# Altium footprint library 3.22-杂项.PcbLib: 985 footprints (part 58 of 64)
Each footprint in its own frame and in the unit in brackets; x right, y up, seen from the top. Pads: shape width x height; smd on the part's side, far side on the other; paste and mask are expansions set on the pad; w line width, h text height; cw(c..) or ccw(c..) is an arc to the next point about the centre after c.
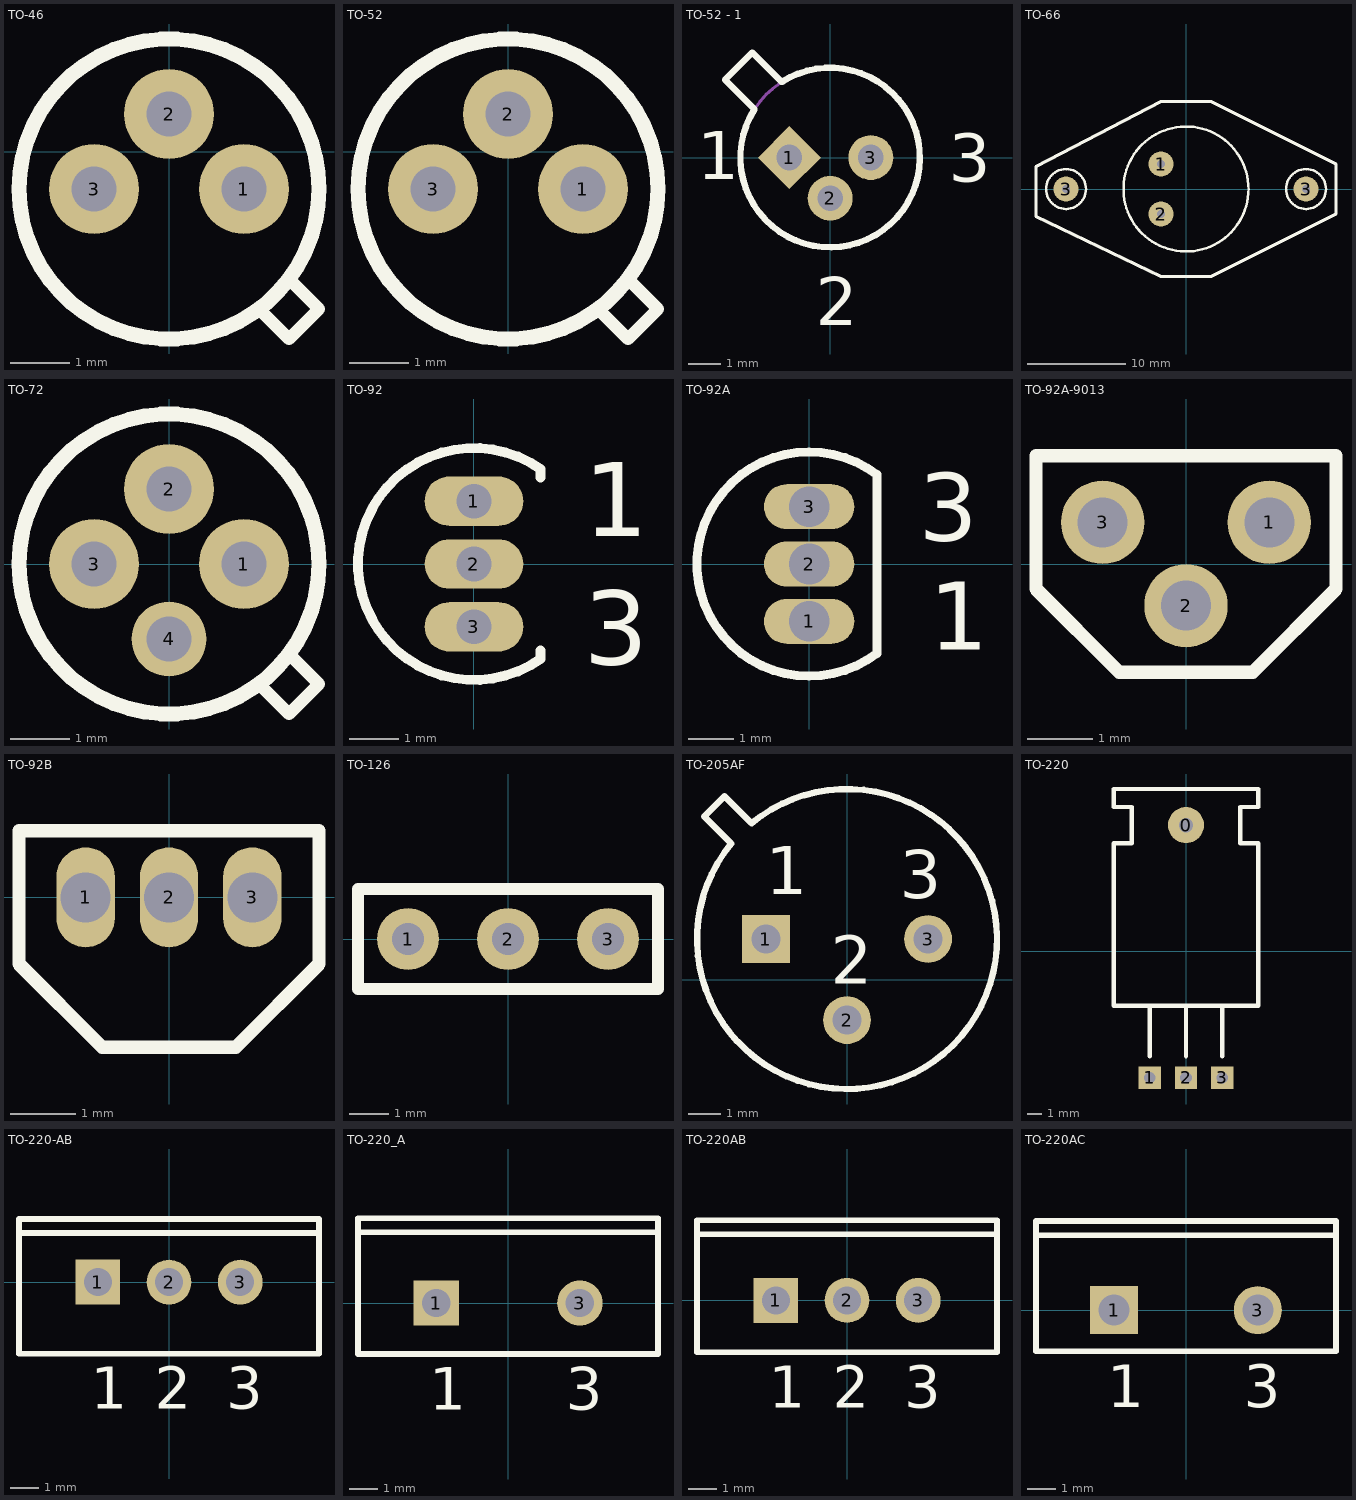
[diagram p57: the footprints below, top view; thin cyan lines are the x and y axes]

## TO-46 [mil]
pads (3):
  round 60 hole 30: 1(50,-25) 2(0,25) 3(-50,-25)
Top Overlay:
  circle w10: c0,-25 r100
  lines w8: 60,-105 80,-125 100,-105 80,-85

## TO-52 [mil]
pads (3):
  round 60 hole 30: 1(50,-25) 2(0,25) 3(-50,-25)
Top Overlay:
  circle w10: c0,-25 r100
  lines w8: 60,-105 80,-125 100,-105 80,-85

## TO-52 - 1 [mm] "Can; 3 Leads; Pin Circle Dia. 2.54 mm"
height 2.67
pads (3):
  rect 1.4x1.4 hole 0.8 rot 45: 1(-1.27,0)
  round 1.4 hole 0.8: 2(0,-1.27) 3(1.27,0)
Top Overlay:
  lines w0.2: -3.277,2.429 -2.429,3.277 -1.51,2.358 cw(c0,0) -2.358,1.51 -3.277,2.429
  text "1" at -4.153,-0.68 h1.5
  text "2" at -0.442,-5.239 h1.5
  text "3" at 3.706,-0.751 h1.5
Mechanical 1:
  circle w0.1: c0,0 r2.8

## TO-66 [mil]
pads (4):
  round 100 hole 32: 1(-100,100) 2(-100,-100) 3(-480,0) 3(480,0)
Top Overlay:
  circle w10: c0,0 r250
  circle w10: c-480,0 r80
  circle w10: c480,0 r80
  lines w12: -600,-110 -600,90 -100,350 100,350 600,100 600,-100 100,-350 -100,-350 -600,-110

## TO-72 [mil]
pads (4):
  round 60 hole 30: 1(50,0) 2(0,50) 3(-50,0)
  round 50 hole 30: 4(0,-50)
Top Overlay:
  circle w10: c0,0 r100
  lines w8: 60,-80 80,-100 100,-80 80,-60

## TO-92 [mm] "TO, Flat Index; 3 In-Line, Axial Leads; Body Dia. 4.6mm; Leads 0.41 x 0.39 mm (max)"
height 4.7
pads (3):
  oval 2x1 hole 0.7: 1(0,1.27) 2(0,0) 3(0,-1.27)
Top Overlay:
  lines w0.2: 1.35,-1.75 1.35,-1.92 cw(c0,0) 1.35,1.92 1.35,1.75
  text "3" at 2.224,-2.035 h1.5
  text "1" at 2.224,0.56 h1.5

## TO-92A [mm] "TO, Flat Index; 3 In-Line, Axial Leads; Body Dia. 4.5mm; Leads 0.51 x 0.48 mm (max)"
height 6.86
pads (3):
  oval 2x1 hole 0.9: 1(0,-1.27) 2(0,0) 3(0,1.27)
Top Overlay:
  lines w0.2: 1.5,-1.98 cw(c0,0) 1.5,1.98 1.5,-1.98
  text "1" at 2.66,-1.9 h1.5
  text "3" at 2.43,0.51 h1.5

## TO-92A-9013 [mil] "如9013:1E,2B,3C"
pads (3):
  round 50 hole 30: 1(50,25) 2(0,-25) 3(-50,25)
Top Overlay:
  lines w8: -90,-15 -90,65 90,65 90,-15 40,-65 -40,-65 -90,-15

## TO-92B [mil]
pads (3):
  oval 35x60 hole 30: 1(-50,0) 2(0,0) 3(50,0)
Top Overlay:
  lines w8: -90,-40 -40,-90 40,-90 90,-40 90,40 -90,40 -90,-40

## TO-126 [mil]
pads (3):
  round 62 hole 32: 1(-100,0) 2(0,0) 3(100,0)
Top Overlay:
  lines w12: -150,-50 150,-50 150,50 -150,50 -150,-50

## TO-205AF [mm] "Can; 3 Leads; Pin Circle Dia. 5.08 mm; Lead Dia. 0.53 mm (max)"
height 4.57
pads (3):
  rect 1.5x1.5 hole 0.9: 1(-2.54,1.27)
  round 1.5 hole 0.9: 2(0,-1.27) 3(2.54,1.27)
Top Overlay:
  lines w0.2: -4.475,5.108 -3.626,4.26 ccw(c0,1.27) -2.99,4.896 -3.838,5.745 -4.475,5.108
  text "1" at -2.54,2.667 h1.5
  text "2" at -0.508,-0.127 h1.5
  text "3" at 1.651,2.54 h1.5

## TO-220 [mil]
pads (4):
  round 100 hole 40: 0(0,350)
  rect 62x62 hole 32: 1(-100,-350) 2(0,-350) 3(100,-350)
Top Overlay:
  lines w12: -100,-290 -100,-150 ; 0,-290 0,-150 ; 100,-290 100,-150 ; -200,-150 200,-150 200,300 150,300 150,400 200,400 200,450 -200,450 -200,400 -150,400 -150,300 -200,300 -200,-150

## TO-220-AB [mm] "TO, Thru-Hole, Vertical, Heatsink Mounted; 3 In-Line Leads; Pitch 2.54 mm"
height 19.1
pads (3):
  rect 1.6x1.6 hole 1: 1(-2.54,0)
  round 1.6 hole 1: 2(0,0) 3(2.54,0)
Top Overlay:
  lines w0.2: -5.35,1.75 5.35,1.75 ; -5.35,-2.55 -5.35,2.25 5.35,2.25 5.35,-2.55 -5.35,-2.55
  text "3" at 2.04,-4.525 h1.5
  text "2" at -0.5,-4.525 h1.5
  text "1" at -2.79,-4.525 h1.5

## TO-220_A [mm] "TO, Thru-Hole, Vertical, Heatsink Mounted; 3 In-Line Leads (1 Absent); Pitch 2.54 mm"
height 19.3
pads (2):
  rect 1.6x1.6 hole 1: 1(-2.54,0)
  round 1.6 hole 1: 3(2.54,0)
Top Overlay:
  lines w0.2: -5.3,2.5 5.3,2.5 ; -5.3,-1.8 5.3,-1.8 5.3,3 -5.3,3 -5.3,-1.8
  text "3" at 2.04,-3.775 h1.5
  text "1" at -2.79,-3.775 h1.5

## TO-220AB [mm] "TO, Thru-Hole, Vertical, Heatsink Mounted; 3 In-Line Leads; Pitch 2.54 mm"
height 19.3
pads (3):
  rect 1.6x1.6 hole 1: 1(-2.54,0)
  round 1.6 hole 1: 2(0,0) 3(2.54,0)
Top Overlay:
  lines w0.2: -5.35,2.35 5.35,2.35 ; -5.35,-1.85 -5.35,2.85 5.35,2.85 5.35,-1.85 -5.35,-1.85
  text "3" at 2.04,-3.825 h1.5
  text "1" at -2.79,-3.825 h1.5
  text "2" at -0.5,-3.825 h1.5

## TO-220AC [mm] "TO, Thru-Hole, Vertical, Heatsink Mounted; 3 In-Line Leads (1 Absent); Pitch 2.54 mm"
height 19.2
pads (2):
  rect 1.7x1.7 hole 1.1: 1(-2.54,0)
  round 1.7 hole 1.1: 3(2.54,0)
Top Overlay:
  lines w0.2: -5.3,2.65 5.3,2.65 ; -5.3,-1.45 -5.3,3.15 5.3,3.15 5.3,-1.45 -5.3,-1.45
  text "3" at 2.04,-3.425 h1.5
  text "1" at -2.79,-3.425 h1.5